# Altium footprint library DrPCB.PcbLib: 910 footprints (part 44 of 57)
Each footprint in its own frame and in the unit in brackets; x right, y up, seen from the top. Pads: shape width x height; smd on the part's side, far side on the other; paste and mask are expansions set on the pad; w line width, h text height; cw(c..) or ccw(c..) is an arc to the next point about the centre after c.
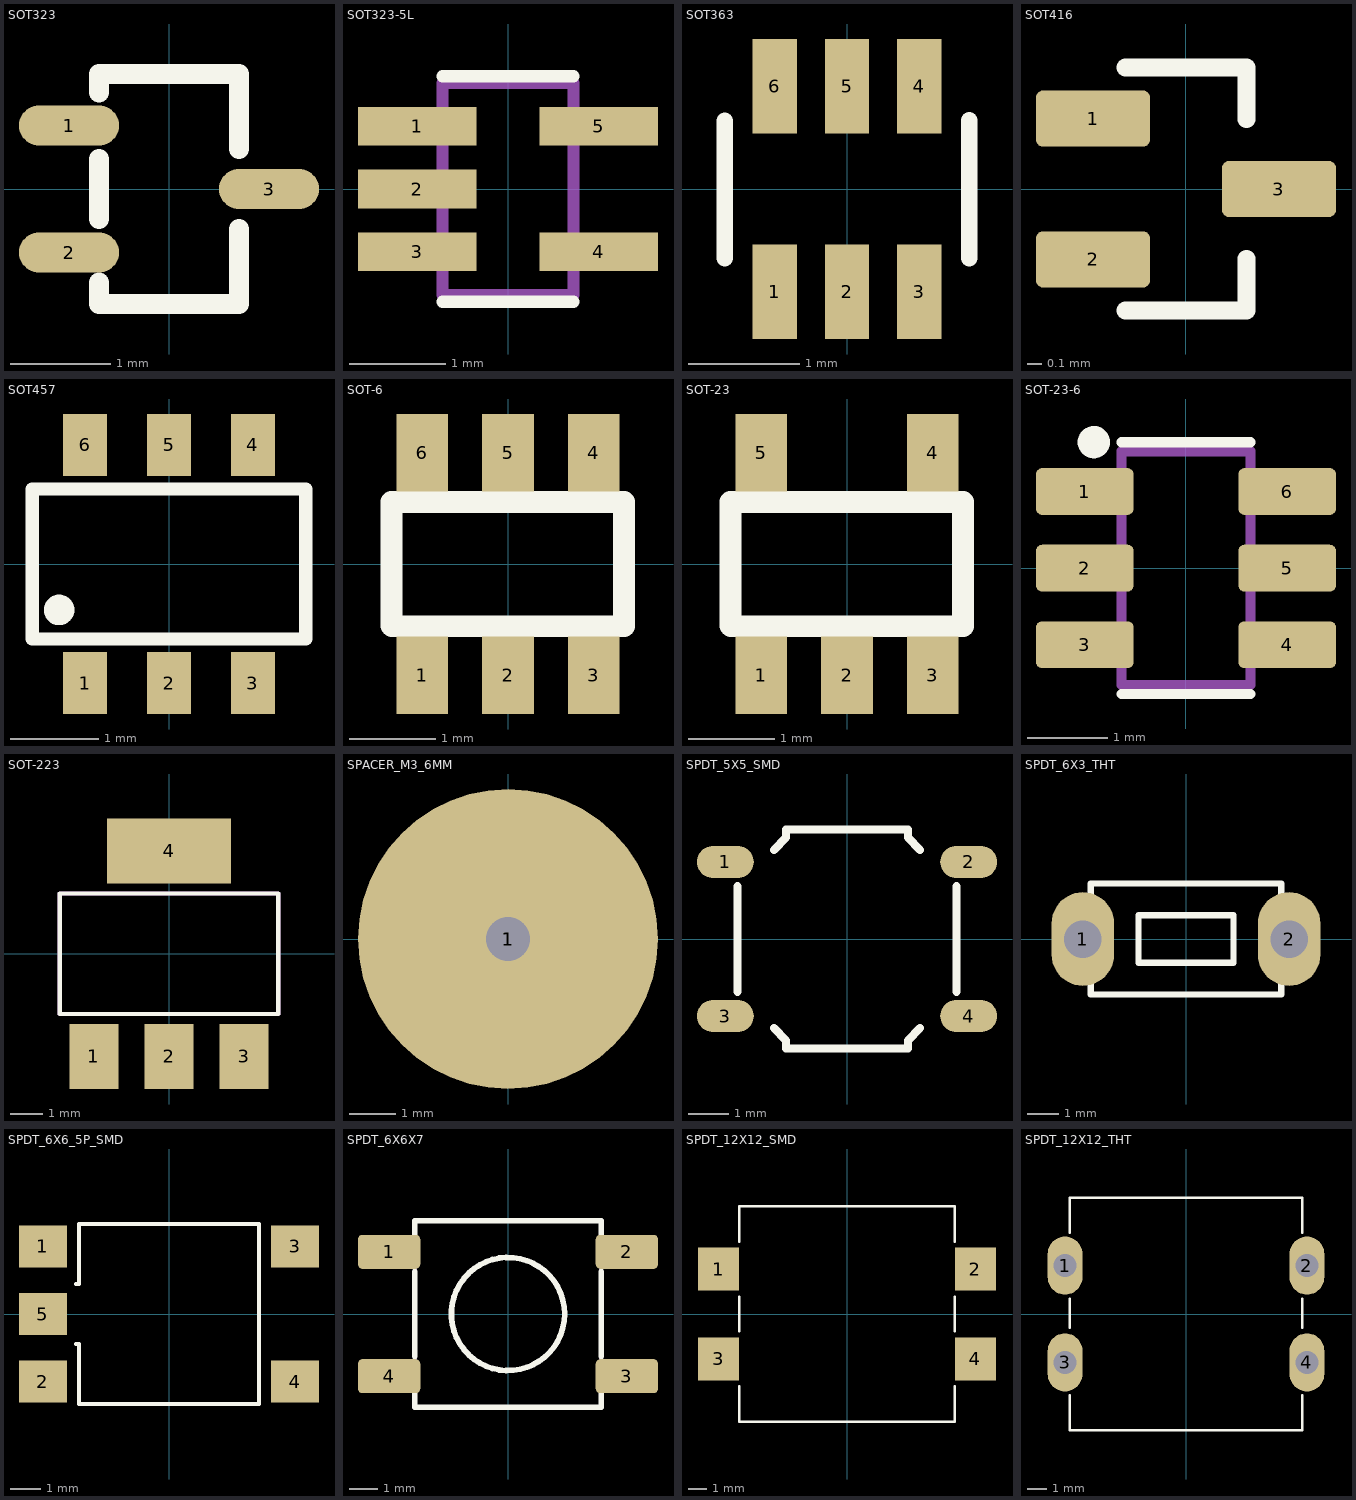
[diagram p43: the footprints below, top view; thin cyan lines are the x and y axes]

## SOT323 [mm] "SOT323, SC-70/SC70-3L, DCK, MO-203, 2X1.25mm, 1.27mm pitch"
pads (3):
  oval 1x0.4 smd: 1(-1,0.635) 2(-1,-0.635) 3(1,0)
Top Overlay:
  lines w0.2: -0.7,-0.935 -0.7,-1.15 0.7,-1.15 0.7,-0.4 ; -0.7,-0.3 -0.7,0.3 ; -0.7,0.965 -0.7,1.15 0.7,1.15 0.7,0.4
3D body "User Library-sc70-3.step": height 1, standoff 0, extent -1.15,-1.05 1.15,1.05

## SOT323-5L [mm]
pads (5):
  rect 1.23x0.4 smd paste-0.075: 1(-0.94,0.65) 2(-0.94,0) 3(-0.94,-0.65) 4(0.94,-0.65) 5(0.94,0.65)
Top Overlay:
  lines w0.127: -0.68,-1.17 0.68,-1.17 ; -0.68,1.17 0.68,1.17
Mechanical 13:
  lines w0.127: -0.68,-1.1 0.68,-1.1 0.68,1.1 -0.68,1.1 -0.68,-1.1
3D body "User Library-SOT-323-5L.step": height 1, standoff 0, extent -1.051,-1.05 1.051,1.05

## SOT363 [mm]
pads (6):
  rect 0.4x0.85 smd: 1(-0.65,-0.925) 2(0,-0.925) 3(0.65,-0.925) 4(0.65,0.925) 5(0,0.925) 6(-0.65,0.925)
Top Overlay:
  lines w0.15: -1.1,-0.624 -1.1,0.613 ; 1.1,-0.624 1.1,0.62
3D body "User Library-SOT363-2.step": height 1.1, standoff 0, extent -1.1,-1.2 1.1,1.2

## SOT416 [mm]
pads (3):
  rrect25% 0.81x0.4 smd: 1(-0.66,0.5) 2(-0.66,-0.5) 3(0.66,0)
Top Overlay:
  lines w0.127: -0.43,-0.864 0.43,-0.864 0.43,-0.495 ; -0.43,0.864 0.43,0.864 0.43,0.495
3D body "User Library-SC-75A.STEP": height 0.72, standoff 0.01, extent -0.8,-0.8 0.8,0.8

## SOT457 [mm]
pads (6):
  rect 0.5x0.7 smd: 1(-0.95,-1.35) 2(0,-1.35) 3(0.95,-1.35) 4(0.95,1.35) 5(0,1.35) 6(-0.95,1.35)
Top Overlay:
  circle w0.254: c-1.245,-0.521 r0.046
  lines w0.15: -1.55,-0.85 -1.55,0.85 ; -1.537,-0.85 1.55,-0.85 1.55,0.85 -1.537,0.85
3D body "User Library-SOT457.STEP": height 1.01, standoff 0.01, extent -1.5,-1.4 1.5,1.4

## SOT-6 [mm]
pads (6):
  rect 0.6x0.9 smd: 1(-1,-1.296) 2(0,-1.296) 3(1,-1.296) 4(1,1.296) 5(0,1.296) 6(-1,1.296)
Top Overlay:
  lines w0.254: -1.356,-0.717 -1.356,0.723 1.349,0.723 1.349,-0.725 -1.351,-0.725
3D body "Trans_ON_Semi_FDC6301N_eec.STEP": height 1.01, standoff 0.01, extent -1.453,-1.401 1.447,1.399

## SOT-23 [mm]
pads (5):
  rect 0.6x0.9 smd paste-0.08: 1(-1,-1.296) 2(0,-1.296) 3(1,-1.296) 4(1,1.296) 5(-1,1.296)
Top Overlay:
  lines w0.254: -1.356,-0.717 -1.356,0.723 1.349,0.723 1.349,-0.725 -1.351,-0.725
3D body "User Library-tsot-23-5.STEP": height 0.99, standoff 0.01, extent -1.45,-1.4 1.45,1.399

## SOT-23-6 [mm]
pads (6):
  rrect25% 1.21x0.58 smd: 1(-1.255,0.95) 2(-1.255,0) 3(-1.255,-0.95) 4(1.255,-0.95) 5(1.255,0) 6(1.255,0.95)
Top Overlay:
  circle w0.2: c-1.143,1.562 r0.1
  lines w0.127: -0.8,-1.56 0.8,-1.56 ; -0.8,1.56 0.8,1.56
Mechanical 13:
  lines w0.127: -0.8,-1.45 -0.8,1.45 0.8,1.45 0.8,-1.45 -0.8,-1.45
3D body "step_temp.STEP": height 1.45, standoff 0, extent -1.4,-1.45 1.4,1.45

## SOT-223 [mm]
pads (4):
  rect 1.5x2 smd: 1(-2.3,-3.15) 2(0,-3.15) 3(2.3,-3.15)
  rect 3.8x2 smd: 4(0,3.15)
Top Overlay:
  lines w0.127: -3.35,-1.85 3.35,-1.85 3.35,1.85 -3.35,1.85 -3.35,-1.85
Mechanical 4:
  lines w0.127: -3.35,-1.85 3.35,-1.85 ; -3.35,-1.85 -3.35,1.85 ; -3.35,-1.85 3.35,-1.85 ; -3.35,-1.85 -3.35,1.85 ; -3.35,1.85 3.35,1.85 ; -3.35,1.85 3.35,1.85 ; 3.35,-1.85 3.35,1.85 ; 3.35,-1.85 3.35,1.85
3D body "CircuitWorks-SOT-223.step": height 1.69, standoff 0.01, extent -3.25,-3.48 3.25,3.48

## SPACER_M3_6MM [mm]
pads (2):
  round 0.95 hole 0.95: 1(0,0)
  round 6.5 smd: 1(0,0)
3D body: height 1, standoff 0, extent -3.25,-3.247 3.25,3.247
3D body "DRM2550006_BUFAB.step": height 6, standoff 0, extent -2.5,-2.5 2.5,2.5

## SPDT_5X5_SMD [mm] "SWITCH, PUSHBUTTON, SMD, SPDT, SKQG Series ; Height 1.5 mm ; 500,000 cycles ; 0.98N Force, SKQGAFE010"
height 1.5
pads (4):
  oval 1.4x0.8 smd mask+0.1: 1(-3,1.9) 2(3,1.9) 3(-3,-1.9) 4(3,-1.9)
Top Overlay:
  lines w0.2: -2.7,-1.3 -2.7,1.3 ; -1.8,-2.2 -1.5,-2.5 -1.5,-2.7 1.5,-2.7 1.5,-2.5 1.8,-2.2 ; -1.8,2.2 -1.5,2.5 -1.5,2.7 1.5,2.7 1.5,2.5 1.8,2.2 ; 2.7,-1.3 2.7,1.3
3D body "SKQGAF.STEP": height 1.53, standoff 0.03, extent -3.2,-2.6 3.2,2.6

## SPDT_6X3_THT [mm] "SWITCH, PUSHBUTTON, THD, SPST, 6X3.5mm"
pads (2):
  oval 2x3 hole 1.2 mask+0.1: 1(-3.3,0) 2(3.3,0)
Top Overlay:
  lines w0.2: -3.048,-1.778 3.048,-1.778 3.048,1.778 -3.048,1.778 -3.048,-1.778 ; -1.524,-0.762 1.524,-0.762 1.524,0.762 -1.524,0.762 -1.524,-0.762
3D body "User Library-DTS-32.STEP": height 5, standoff -3.51, extent -3.878,-1.75 3.878,1.75

## SPDT_6X6_5P_SMD [mm]
pads (5):
  rect 1.6x1.4 smd: 1(-4.2,2.25) 2(-4.2,-2.25) 3(4.2,2.25) 4(4.2,-2.25) 5(-4.2,0)
Top Overlay:
  lines w0.127: -3.1,-1 -3,-1 -3,-3 3,-3 3,3 -3,3 -3,1 -3.1,1
3D body "User Library-TETactileSwitch1571636.step": height 2.67, standoff 0.01, extent -4.1,-3.25 4.1,3.25

## SPDT_6X6X7 [mm] "SWITCH, PUSHBUTTON, SMD, SPDT, 7.0mm, TS-1170S"
height 7
pads (4):
  rrect25% 2.2x1.2 smd mask+0.1: 1(-4.2,2.197) 2(4.2,2.197) 3(4.2,-2.197) 4(-4.2,-2.197)
Top Overlay:
  circle w0.2: c0,0 r2
  lines w0.2: -3.3,-2.8 -3.3,-3.3 3.3,-3.3 3.3,-2.8 ; -3.3,-1.5 -3.3,1.5 ; -3.3,2.8 -3.3,3.3 3.3,3.3 3.3,2.8 ; 3.3,-1.5 3.3,1.5
Mechanical 13:
  lines w0.05: -3.25,-3.25 -3.25,3.25 3.25,3.25 3.25,-3.25 -3.25,-3.25
3D body "TS-1170S-WP.stp": height 7, standoff 0, extent -4,-3.25 4,3.25

## SPDT_12X12_SMD [mm]
pads (4):
  rect 2.3x2.4 smd: 1(-7.15,2.5) 2(7.15,2.5) 3(-7.15,-2.5) 4(7.15,-2.5)
Top Overlay:
  lines w0.127: -6,-4.02 -6,-6 6,-6 6,-4.02 ; -6,-0.98 -6,0.98 ; -6,4.02 -6,6 6,6 6,4.02 ; 6,-0.98 6,0.98
3D body "User Library-Button B3FS-4002P.step": height 4.3, standoff -0.1, extent -7.5,-6 7.5,6

## SPDT_12X12_THT [mm]
pads (4):
  oval 1.8x3 hole 1.2: 1(-6.25,2.5) 2(6.25,2.5) 3(-6.25,-2.5) 4(6.25,-2.5)
Top Overlay:
  lines w0.127: -6,-4.2 -6,-6 6,-6 6,-4.2 ; -6,-0.715 -6,0.785 ; -6,4.2 -6,6 6,6 6,4.2 ; 6,-0.715 6,0.785
3D body "430456043736.stp": height 4.3, standoff -3.5, extent -6.986,-6 6.986,6